# Altium footprint library transistors.PcbLib: 40 footprints (part 3 of 3)
Each footprint in its own frame and in the unit in brackets; x right, y up, seen from the top. Pads: shape width x height; smd on the part's side, far side on the other; paste and mask are expansions set on the pad; w line width, h text height; cw(c..) or ccw(c..) is an arc to the next point about the centre after c.
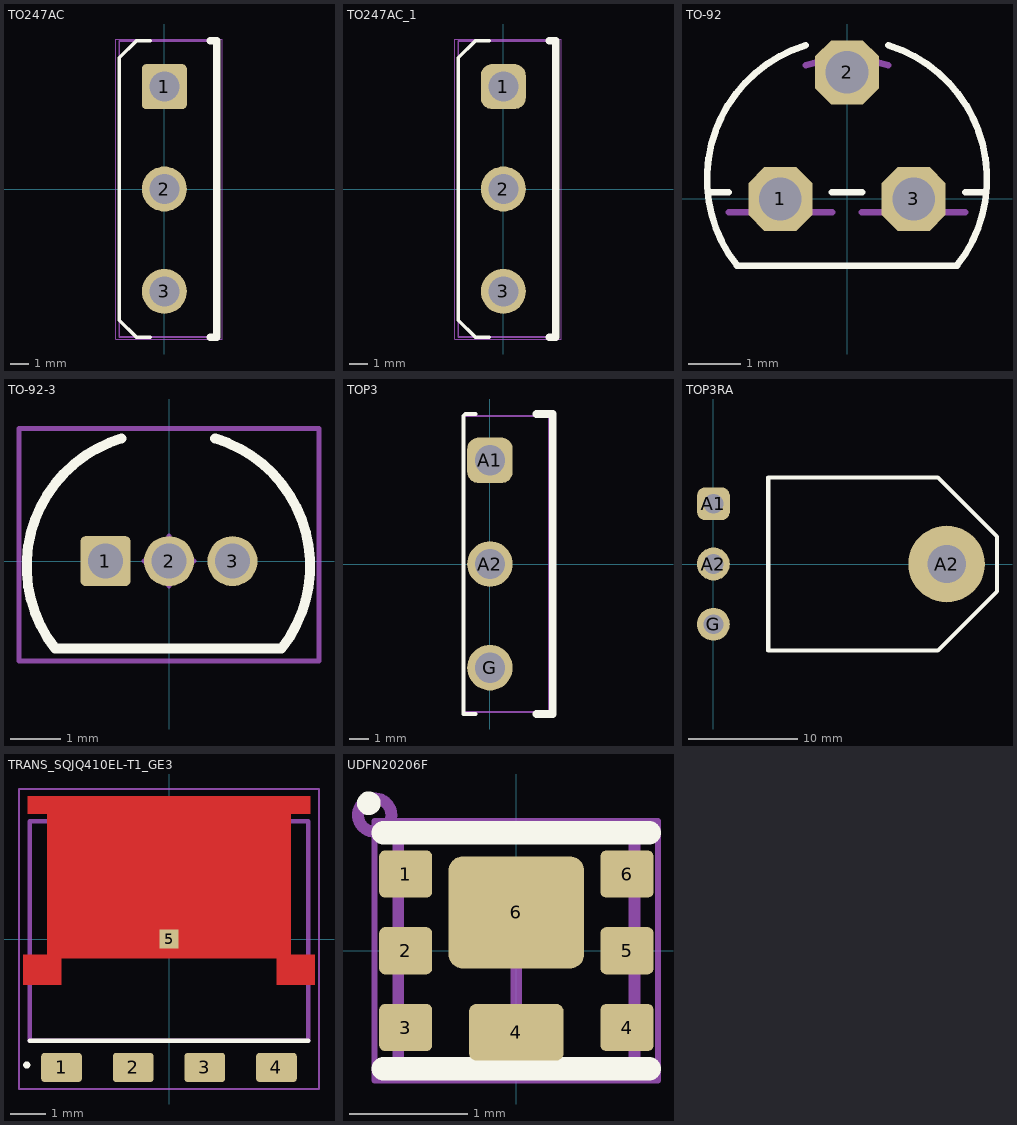
[diagram p2: the footprints below, top view; thin cyan lines are the x and y axes]

## TO247AC [mm] "IRFP460 , DPAK, IPC"
height 2.4
pads (3):
  rrect20% 2.4x2.4 hole 1.6: 1(0,5.46)
  round 2.4 hole 1.6: 2(0,0) 3(0,-5.46)
Top Overlay:
  lines w0.2: -0.75,-7.9 -1.5,-7.9 -2.4,-7 -2.4,7 -1.5,7.9 -0.75,7.9
  lines w0.4: 2.45,-7.9 2.8,-7.9 2.8,7.9 2.45,7.9
M3_comm_top:
  text ".comment" at -1.7,-0.4 h1
M5_asm_top:
  text ".Designator" at -1.5,8.3 h1
M7_courtyard_top:
  lines w0.1: -0.5,0 0.5,0 ; 0,-0.5 0,0.5
Mechanical 13:
  lines w0.1: -2.4,-7.9 2.9,-7.9 2.9,7.9 -2.4,7.9 -2.4,-7.9
Mechanical 15:
  lines w0.05: -2.6,-8 3.1,-8 3.1,8 -2.6,8 -2.6,-8
  lines w0.1: -0.5,0 0.5,0 ; 0,-0.5 0,0.5
3D body "TO_247.step": height 11.05, standoff -25, extent -2.4,-7.9 2.91,7.9

## TO247AC_1 [mm] "DPAK, IPC"
height 2.4
pads (3):
  rrect50% 2.4x2.4 hole 1.6: 1(0,5.46)
  round 2.4 hole 1.6: 2(0,0) 3(0,-5.46)
Top Overlay:
  lines w0.2: -0.75,-7.9 -1.5,-7.9 -2.4,-7 -2.4,7 -1.5,7.9 -0.75,7.9
  lines w0.4: 2.45,-7.9 2.8,-7.9 2.8,7.9 2.45,7.9
Mechanical 13:
  lines w0.1: -2.4,-7.9 2.9,-7.9 2.9,7.9 -2.4,7.9 -2.4,-7.9
Mechanical 15:
  lines w0.05: -2.6,-8 3.1,-8 3.1,8 -2.6,8 -2.6,-8
  lines w0.1: -0.5,0 0.5,0 ; 0,-0.5 0,0.5
3D body "TO-247 CASE 340L-02 Vertical.stp": height 25.65, standoff -3.9, extent -2.2,-8 2.8,8

## TO-92 [mil] "TO-92"
pads (3):
  oct 48x48 hole 32: 1(-50,0) 2(0,95) 3(50,0)
Top Overlay:
  lines w5: -104.52,5 -88.73,5 ; -30.96,115.33 ccw(c0,15) -82.46,-50 82.46,-50 ccw(c0,15) 30.96,115.33 ; -11.27,5 11.27,5 ; 88.73,5 104.52,5
Mechanical 16:
  lines w5: -88.73,-10 -11.27,-10 ; -30.96,100.33 cw(c0,-0.02) 30.96,100.33 ; 11.27,-10 88.73,-10
3D body "TO-92_CB127SF127.stp": height 334.65, standoff -157.48, extent -98.42,-10.62 98.43,145.68

## TO-92-3 [mm] "DS18S20+"
pads (3):
  rrect20% 1x1 hole 0.7: 1(-1.27,0)
  round 1 hole 0.7: 2(0,0) 3(1.27,0)
Top Overlay:
  lines w0.2: -2.275,-1.75 cw(c-0.181,-0.099) -0.947,2.456 ccw(c-0.181,-0.099) -2.275,-1.75 ; -2.275,-1.75 2.25,-1.75 ; -2.275,-1.75 2.25,-1.75 ; 2.25,-1.75 ccw(c0.156,-0.099) 0.922,2.456 cw(c0.156,-0.099) 2.25,-1.75
M3_comm_top:
  text ".comment" at 0,0 h1
M5_asm_top:
  lines w0.1: -0.936,2.456 ccw(c-0.169,-0.099) -2.264,-1.75 2.261,-1.75 ccw(c0.167,-0.099) 0.933,2.456
  text ".Designator" at -0.475,2.75 h1
M7_courtyard_top:
  lines w0.1: -0.5,0 0.5,0 ; 0,-0.5 0,0.5 ; -3,-2 -3,2.65 3,2.65 3,-2 -3,-2
3D body "ALSRobot-TO-92A.STEP": height 8, standoff -3, extent -2.4,-1.53 2.4,2.4

## TOP3 [mm] "DPAK, IPC"
height 2.4
pads (3):
  rrect50% 2.4x2.4 hole 1.6: A1(0,5.46)
  round 2.4 hole 1.6: A2(0,0) G(0,-5.46)
Top Overlay:
  lines w0.2: -0.75,-7.9 -1.4,-7.9 -1.4,7.8 -1.3,7.9 -0.75,7.9
  lines w0.4: 2.45,-7.9 3.3,-7.9 3.3,7.9 2.45,7.9
Mechanical 13:
  lines w0.1: -1.4,-7.8 3.1,-7.8 3.1,7.8 -1.4,7.8 -1.4,-7.8
Mechanical 15:
  lines w0.05: -1.4,-7.8 3.1,-7.8 3.1,7.8 -1.4,7.8 -1.4,-7.8
  lines w0.1: -0.5,0 0.5,0 ; 0,-0.5 0,0.5
3D body "TOP3.step": height 22.9, standoff -13, extent -1.4,-7.75 3.1,7.75

## TOP3RA [mm] "DPAK, IPC"
height 2.4
pads (4):
  rrect50% 3x3 hole 1.8: A1(0,5.5)
  round 3 hole 1.8: A2(0,0) G(0,-5.5)
  round 7 hole 3.5: A2(21.3,0)
Top Overlay:
  lines w0.4: 20.5,-7.9 5,-7.9 5,7.9 20.5,7.9 25.9,2.5 25.9,-2.5 ; 20.5,-7.9 25.9,-2.5 ; 20.5,-7.9 25.9,-2.5
Mechanical 15:
  lines w0.1: -0.5,0 0.5,0 ; 0,-0.5 0,0.5
3D body: height 3.37, standoff -1, extent -0.4,4.85 0.4,6.15
3D body: height 3.37, standoff -1, extent -0.4,-0.65 0.4,0.65
3D body: height 3.37, standoff -1, extent -0.4,-6.15 0.4,-4.85
3D body "TOP3_cut.stp": height 4.5, standoff 0, extent 0,-7.75 25.9,7.75

## TRANS_SQJQ410EL-T1_GE3 [mm]
pads (5):
  rrect20% 1.15x0.82 smd: 1(-3.045,-3.64) 2(-1.015,-3.64) 3(1.015,-3.64) 4(3.045,-3.64)
  rect 0.54x0.54 smd: 5(0,0)
Top Layer:
  region: -4,4.05 4,4.05 4,3.55 3.45,3.55 3.45,-0.44 4.125,-0.44 4.125,-1.29 3.055,-1.29 3.055,-0.54 -3.055,-0.54 -3.055,-1.29 -4.125,-1.29 -4.125,-0.44 -3.45,-0.44 -3.45,3.55 -4,3.55
Top Overlay:
  circle w0.1: c-4.03,-3.57 r0.05
  lines w0.127: -3.95,-2.88 3.95,-2.88
Top Paste:
  region: -4,4.05 4,4.05 4,3.55 3.45,3.55 3.45,-0.44 4.125,-0.44 4.125,-1.29 3.055,-1.29 3.055,-0.54 -3.055,-0.54 -3.055,-1.29 -4.125,-1.29 -4.125,-0.44 -3.45,-0.44 -3.45,3.55 -4,3.55
Top Solder:
  region: -4.05,4.1 4.05,4.1 4.05,3.5 3.5,3.5 3.5,-0.39 4.175,-0.39 4.175,-1.34 3.005,-1.34 3.005,-0.59 -3.005,-0.59 -3.005,-1.34 -4.175,-1.34 -4.175,-0.39 -3.5,-0.39 -3.5,3.5 -4.05,3.5
M1_3D_TOP:
  lines w0.05: -4.25,-4.25 -4.25,4.25 4.25,4.25 4.25,-4.25 -4.25,-4.25
  lines w0.127: -3.95,-2.88 -3.95,3.34 3.95,3.34 3.95,-2.88 -3.95,-2.88
3D body "PowerPAK_8x8l.STEP": height 1.01, standoff 0.01, extent -4,-4 4,4

## UDFN20206F [mm] "DMP6110SFDF, PSON, IPC Medium Density"
height 1.1
pads (8):
  rrect25% 0.45x0.4 smd mask+0: 1(-0.937,0.65) 2(-0.937,0) 3(-0.937,-0.65) 4(0.937,-0.65) 5(0.937,0) 6(0.937,0.65)
  rrect25% 0.8x0.48 smd mask+0: 4(0,-0.69)
  rrect25% 1.15x0.95 smd mask+0: 6(0,0.325)
Top Overlay:
  circle w0.1: c-1.25,1.25 r0.05
  lines w0.2: -1.125,-1 1.125,-1 ; -1.125,1 1.125,1
Mechanical 13:
  circle w0.1: c-1.2,1.15 r0.141
  lines w0.1: -1,-1 -1,1 1,1 1,-1 -1,-1
Mechanical 15:
  lines w0.05: -1.2,-1.1 -1.2,1.1 1.2,1.1 1.2,-1.1 -1.2,-1.1
  lines w0.1: -0.5,0 0.5,0 ; 0,-0.5 0,0.5
3D body: height 0.63, standoff 0.01, extent -1,-1 1,1